# Altium footprint library Potentiometer.PcbLib: 55 footprints (part 4 of 4)
Each footprint in its own frame and in the unit in brackets; x right, y up, seen from the top. Pads: shape width x height; smd on the part's side, far side on the other; paste and mask are expansions set on the pad; w line width, h text height; cw(c..) or ccw(c..) is an arc to the next point about the centre after c.
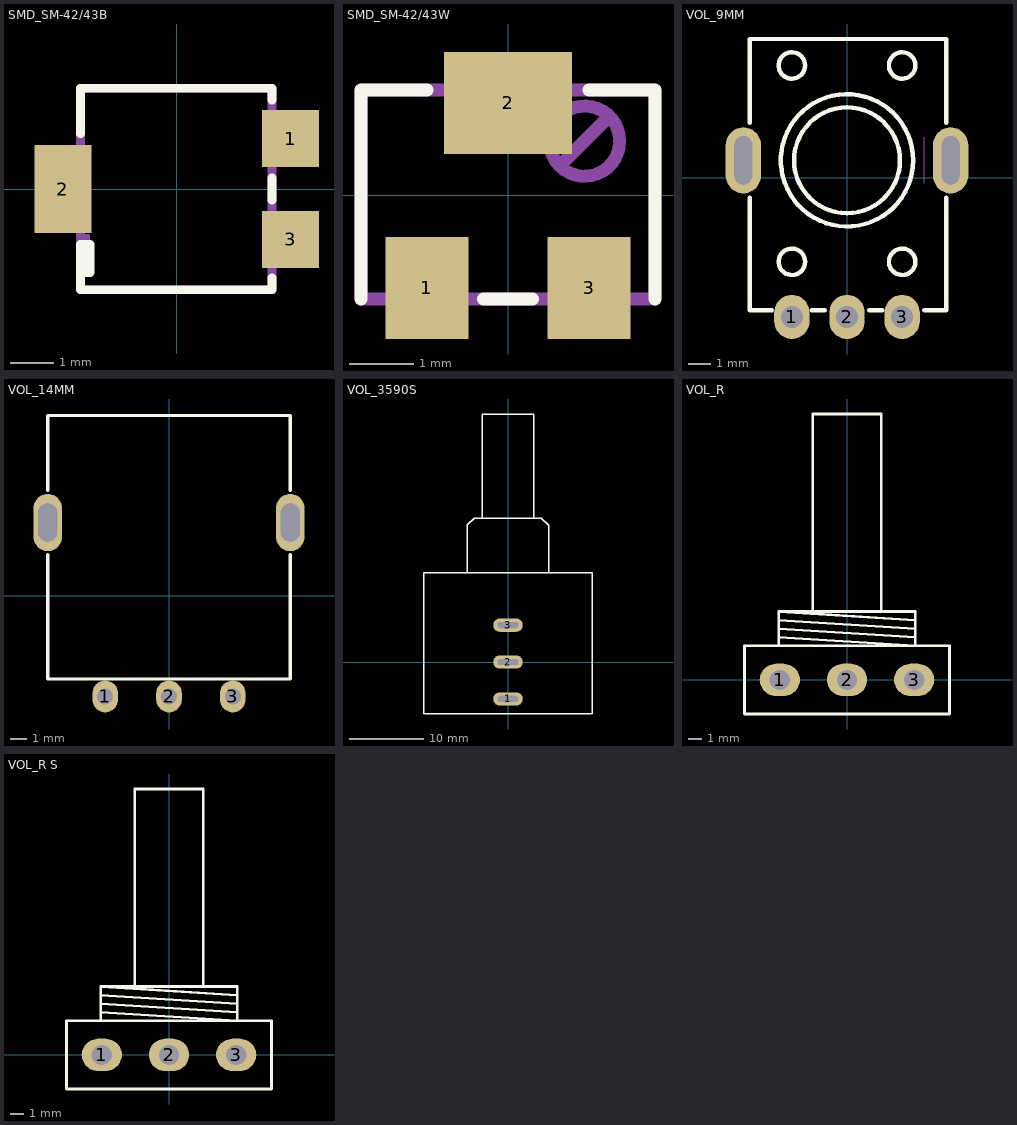
[diagram p3: the footprints below, top view; thin cyan lines are the x and y axes]

## SMD_SM-42/43B [mm]
pads (3):
  rect 1.3x1.3 smd: 1(2.6,1.15) 3(2.6,-1.15)
  rect 1.3x2 smd: 2(-2.6,0)
Top Overlay:
  region: -1.975,-1.905 -1.975,-1.27 -2.3,-1.27 -2.3,-1.905
  lines w0.203: -2.2,-1.905 -1.975,-1.905 -1.975,-1.27 -2.2,-1.27 -2.2,-2.3 2.175,-2.3 2.175,-2.032 ; -2.2,1.27 -2.2,2.3 2.175,2.3 2.175,2.032 ; 2.175,-0.254 2.175,0.254
Mechanical 1:
  region: -1.975,-1.925 -1.975,-1.025 -2.3,-1.025 -2.3,-1.925
  region: 3,-1.675 3,-0.875 2.2,-0.875 2.2,-1.675
  region: 3,0.875 3,1.675 2.2,1.675 2.2,0.875
  region: -2.2,-0.65 -2.2,0.65 -2.975,0.65 -2.975,-0.65
  lines w0.203: -2.2,-2.3 -2.2,2.3 2.175,2.3 2.175,-2.3 -2.2,-2.3
3D body "SW3dPS-Bourns 3314G potentiometer x1.STEP": height 2.55, standoff 0, extent -3.1,-2.5 3.1,2.5

## SMD_SM-42/43W [mm]
pads (3):
  rect 1.3x1.6 smd: 1(-1.27,-1.45) 3(1.27,-1.45)
  rect 2x1.6 smd: 2(0,1.45)
Top Overlay:
  lines w0.203: -2.3,-1.625 -2.3,1.65 -1.27,1.65 ; -0.381,-1.625 0.381,-1.625 ; 1.27,1.65 2.3,1.65 2.3,-1.625
Mechanical 1:
  circle w0.203: c1.2,0.85 r0.55
  rectangle: -0.65,1.65 0.65,1.95
  rectangle: 0.875,-1.95 1.675,-1.65
  rectangle: -1.675,-1.95 -0.875,-1.65
  lines w0.203: 0.875,0.525 1.525,1.175 ; -2.3,-1.625 -2.3,1.65 2.3,1.65 2.3,-1.625 -2.3,-1.625
3D body "SW3dPS-3224W.STEP": height 5.3, standoff 0, extent -2.4,-1.95 2.4,1.95

## VOL_9MM [mm] "VOULME  9mm Alpha Alps, RV09ACF EVUF"
height 0.508
pads (5):
  oval 1.6x2 / inner round 1.4 / far side oval 1.6x2 hole 1: 1(-2.5,-6.3) 2(0,-6.3) 3(2.5,-6.3)
  oval 1.6x3 hole 0.8 slot 2.2 at 90 deg: ""(-4.7,0.8) ""(4.7,0.8)
Top Overlay:
  circle w0.2: c-2.5,-3.8 r0.6
  circle w0.2: c2.5,-3.8 r0.6
  circle w0.2: c-2.5,5.1 r0.6
  circle w0.2: c2.5,5.1 r0.6
  circle w0.2: c0,0.8 r3
  circle w0.2: c0,0.8 r2.4
  lines w0.2: -4.4,-0.9 -4.4,-6 -3.4,-6 ; -4.4,2.5 -4.4,6.3 4.5,6.3 4.5,2.5 ; -1.6,-6 -1,-6 ; 1,-6 1.6,-6 ; 3.5,-6 4.5,-6 4.5,-0.9
Mechanical 1:
  lines w0.008: 3.5,-0.25 3.5,1.85
3D body "User Library-RV09ACF-40_RK09K1130A5R.step": height 20.1, standoff -3.7, extent -4.902,-6.428 4.849,6.122

## VOL_14MM [mm] "VOULME  14mm, RV141F-40E3"
height 0.508
pads (5):
  oval 1.6x2 / inner round 1.4 / far side oval 1.6x2 hole 1: 1(-4,-6.3) 2(0,-6.3) 3(4,-6.3)
  oval 1.8x3.6 hole 1.2 slot 2.4 at 90 deg: ""(-7.6,4.6) ""(7.6,4.6)
Top Overlay:
  lines w0.2: -7.6,2.6 -7.6,-5.2 7.6,-5.2 7.6,2.6 ; -7.6,6.6 -7.6,11.3 7.6,11.3 7.6,6.6
3D body "User Library-RV141F-40E3-18BL-003.step": height 24.8, standoff -3.5, extent -8.198,-6.5 8.198,11.578

## VOL_3590S [mm] "VOULME 3590S"
height 0.508
pads (3):
  oval 4x1.8 hole 0.8 slot 2.8 at 0 deg: 1(0,-5) 2(0,0) 3(0,5)
Top Overlay:
  lines w0.2: -5.5,12.14 -5.5,18.6 -4.6,19.5 4.5,19.5 5.5,18.5 5.5,12.14 ; -3.5,19.5 -3.5,33.6 3.5,33.6 3.5,19.5 ; -11.4,-7.04 11.4,-7.04 11.4,12.1 -11.4,12.1 -11.4,-7.04
3D body "User Library-Bourns 3590S-2-502L.step": height 23.1, standoff -3.73, extent -11.3,-6.9 11.3,33.5

## VOL_R [mm] "VOULME RIGHT ANGLE"
height 0.508
pads (3):
  oval 3x2.4 hole 1.5: 1(-5,0) 2(0,0) 3(5,0)
Top Overlay:
  lines w0.2: -5.08,2.54 -5.08,5.08 ; -5.08,3.175 5.08,2.54 5.08,5.08 -5.08,5.08 ; -5.08,3.81 5.08,3.175 ; -5.08,4.445 5.08,3.81 ; -2.54,5.08 -2.54,19.781 2.54,19.781 2.54,5.08 ; 5.08,4.445 -5.08,5.08 ; -7.62,-2.54 -7.62,2.54 7.62,2.54 7.62,-2.54 -7.62,-2.54
3D body "SW3dPS-Pot.STEP": height 20.64, standoff -4, extent -7.947,-4.998 7.801,20.56

## VOL_R S [mm] "VOULME RIGHT ANGLE"
height 0.508
pads (3):
  oval 3x2.4 hole 1.5: 1(-5,0) 2(0,0) 3(5,0)
Top Overlay:
  lines w0.2: -5.08,2.54 -5.08,5.08 ; -5.08,3.175 5.08,2.54 5.08,5.08 -5.08,5.08 ; -5.08,3.81 5.08,3.175 ; -5.08,4.445 5.08,3.81 ; -2.54,5.08 -2.54,19.781 2.54,19.781 2.54,5.08 ; 5.08,4.445 -5.08,5.08 ; -7.62,-2.54 -7.62,2.54 7.62,2.54 7.62,-2.54 -7.62,-2.54
3D body "SW3dPS-Pot.STEP": height 20.64, standoff -4, extent -7.947,-4.998 7.801,20.56
3D body "volome cover2.STEP": height 24.54, standoff 2.14, extent -10.761,7.8 10.932,27.8